# Altium footprint library lib_protel_HC_BOINA.PCBLIB: 726 footprints (part 5 of 46)
Each footprint in its own frame and in the unit in brackets; x right, y up, seen from the top. Pads: shape width x height; smd on the part's side, far side on the other; paste and mask are expansions set on the pad; w line width, h text height; cw(c..) or ccw(c..) is an arc to the next point about the centre after c.
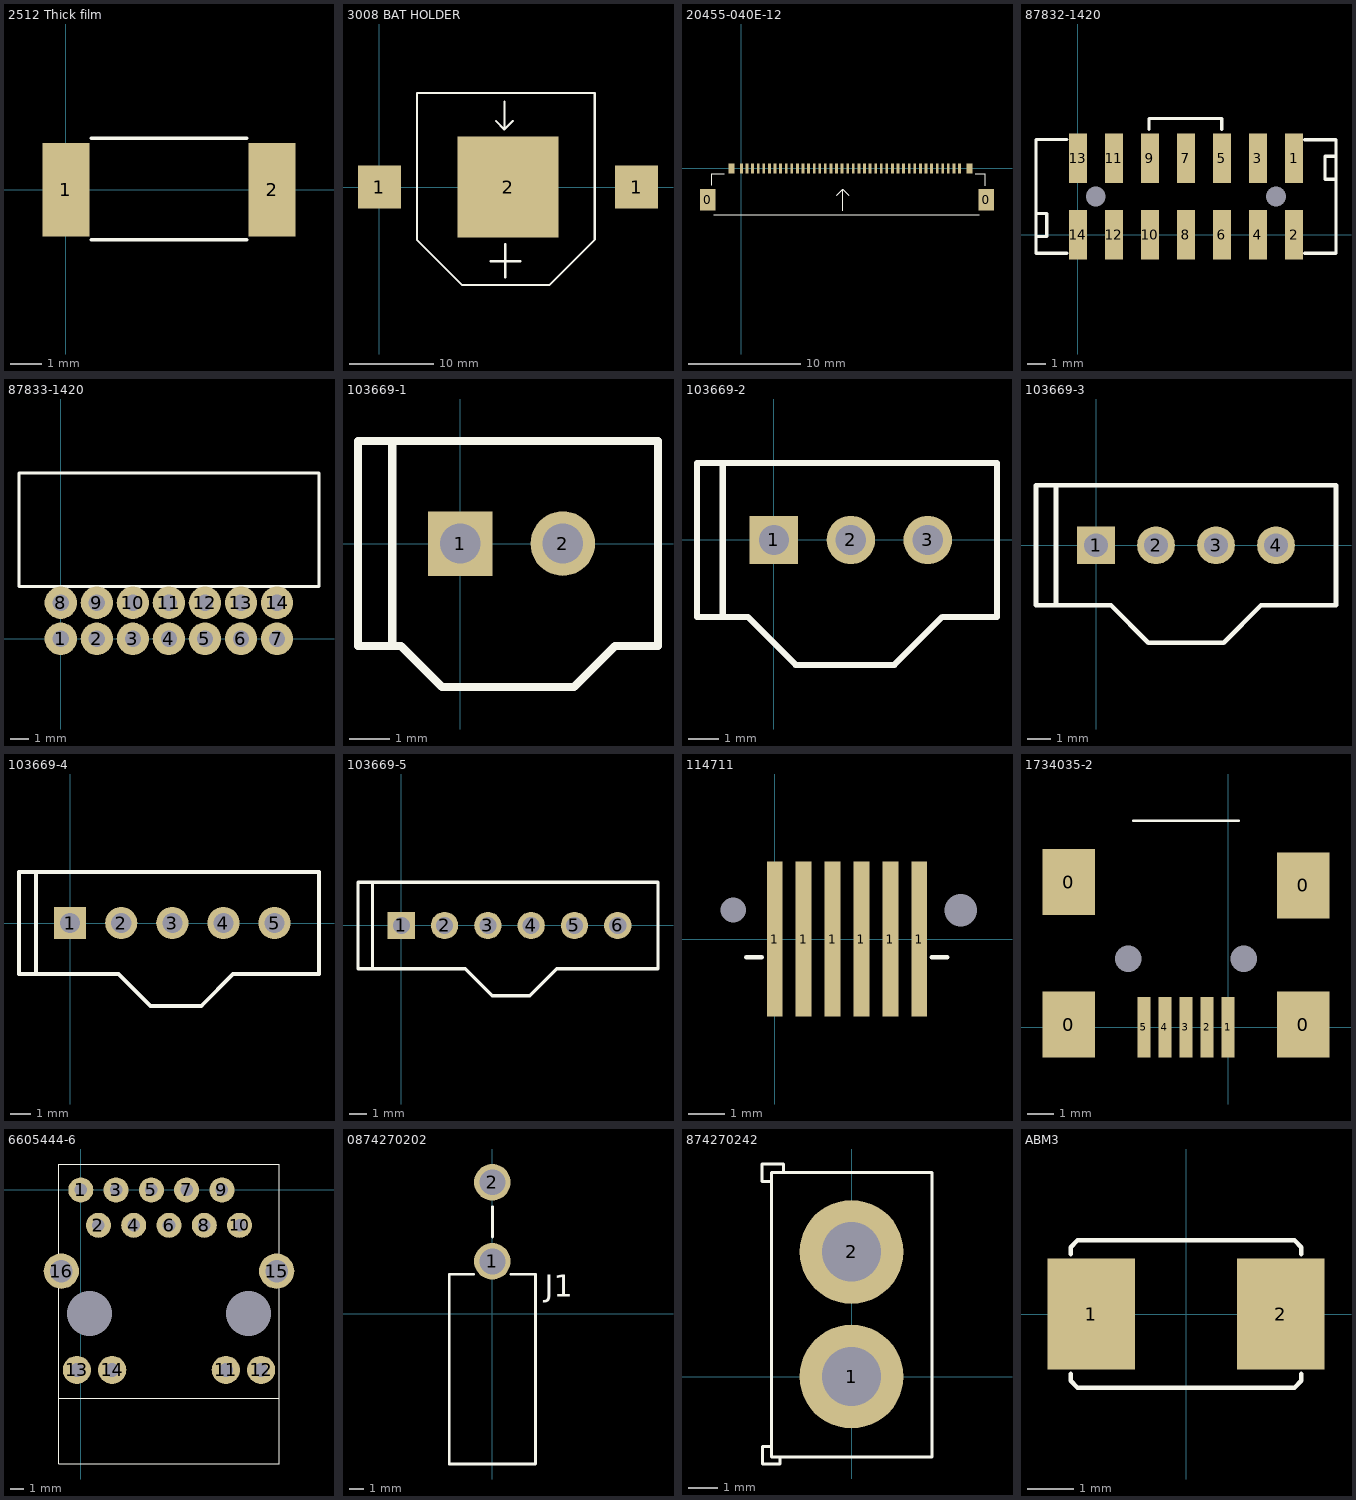
[diagram p4: the footprints below, top view; thin cyan lines are the x and y axes]

## 2512 Thick film [mm] "Thick film 2512"
height 0.55
pads (2):
  rect 1.5x3 smd: 1(0,0) 2(6.6,0)
Top Overlay:
  lines w0.1: 0.8,-1.6 5.8,-1.6 ; 0.8,1.65 5.8,1.65
3D body "User Library-RESC6432X06.step": height 0.6, standoff 0, extent 0.1,-1.6 6.5,1.6

## 3008 BAT HOLDER [mm] "PORTAPILAS PARA CR2450 O LIR2450"
height 5.8
pads (3):
  rect 5.1x5.1 smd: 1(0,0) 1(30.5,0)
  rect 12x12 smd: 2(15.25,0)
Top Overlay:
  lines w0.254: 4.44,-5.854 4.44,-1.79 4.44,11.18 25.54,11.18 ; 4.44,-5.803 4.44,-6.26 9.825,-11.645 9.85,-11.645 20.137,-11.645 25.547,-6.235 25.547,-5.854 25.547,-1.79 25.547,11.18 ; 13.152,-8.8 14.93,-8.8 16.708,-8.8 ; 13.809,7.851 14.825,6.835 ; 14.825,10.137 14.825,6.835 ; 14.93,-10.705 14.93,-6.768 ; 15.841,7.851 14.825,6.835

## 20455-040E-12 [mm] "CONNECTOR IPEX 20455-040E-12"
height 1
pads (44):
  rect 1.4x1.9 smd: 0(-3.025,-2.82) 0(21.9,-2.82)
  rect 0.55x0.9 smd: 0(-0.9,0) 0(20.4,0)
  rect 0.25x0.9 smd: 1(19.5,0) 2(19,0) 3(18.5,0) 4(18,0) 5(17.5,0) 6(17,0) 7(16.5,0) 8(16,0) 9(15.5,0) 10(15,0) 11(14.5,0) 12(14,0) 13(13.5,0) 14(13,0) 15(12.5,0) 16(12,0) 17(11.5,0) 18(11,0) 19(10.5,0) 20(10,0) 21(9.5,0) 22(9,0) 23(8.5,0) 24(8,0) 25(7.5,0) 26(7,0) 27(6.5,0) 28(6,0) 29(5.5,0) 30(5,0) 31(4.5,0) 32(4,0) 33(3.5,0) 34(3,0) 35(2.5,0) 36(2,0) 37(1.5,0) 38(1,0) 39(0.5,0) 40(0,0)
Top Overlay:
  lines w0.1: -2.65,-1.525 -2.65,-0.475 -1.525,-0.475 ; -2.475,-4.15 21.275,-4.15 ; 8.525,-2.4 9.05,-1.875 ; 9.05,-3.8 9.05,-1.875 ; 9.05,-1.9 9.05,-1.875 ; 9.575,-2.4 9.05,-1.875 ; 20.9,-0.475 21.8,-0.475 21.8,-1.575

## 87832-1420 [mm] "CONECTOR MOLEX PROG JTAG"
height 7.6
pads (16):
  round 0 hole 1.1: 0(1,2.12) 0(11,2.12)
  rect 1x2.75 smd: 1(12,4.25) 2(12,0) 3(10,4.25) 4(10,0) 5(8,4.25) 6(8,0) 7(6,4.25) 8(6,0) 9(4,4.25) 10(4,0) 11(2,4.25) 12(2,0) 13(0,4.25) 14(0,0)
Top Overlay:
  lines w0.178: -2.32,1.16 -2.31,1.17 -1.72,1.17 -1.72,-0.1 -2.31,-0.1 ; -2.32,5.27 -2.32,-1.03 -0.6,-1.03 ; -2.32,5.28 -0.61,5.28 ; 3.95,5.85 3.95,6.45 7.99,6.45 7.99,5.84 ; 12.59,5.27 14.33,5.27 14.33,-1.03 12.6,-1.03 ; 14.31,4.35 13.72,4.35 13.72,3.08 14.31,3.08 14.32,3.09

## 87833-1420 [mm] "CONECTOR MOLEX PROG JTAG"
height 6.3
pads (14):
  round 1.8 hole 0.9: 1(0,0) 2(2,0) 3(4,0) 4(6,0) 5(8,0) 6(10,0) 7(12,0) 8(0,2) 9(2,2) 10(4,2) 11(6,2) 12(8,2) 13(10,2) 14(12,2)
Top Overlay:
  lines w0.178: -2.32,2.9 14.33,2.9 14.33,9.2 -2.32,9.2 -2.32,2.9

## 103669-1 [mm] "1X2 LOCKING CONNECTOR"
height 13.6
pads (2):
  rect 1.6x1.6 hole 1: 1(0,0)
  round 1.6 hole 1: 2(2.54,0)
Top Overlay:
  lines w0.2: -1.69,-2.54 -1.69,2.54 ; 3.785,-2.591 3.835,-2.54 4.902,-2.54 4.902,2.54 -2.54,2.54 -2.54,-2.54 -1.473,-2.54 -0.457,-3.556 2.819,-3.556 3.81,-2.565

## 103669-2 [mm] "1X3 LOCKING CONNECTOR"
height 13.6
pads (3):
  rect 1.6x1.6 hole 1: 1(0,0)
  round 1.6 hole 1: 2(2.54,0) 3(5.08,0)
Top Overlay:
  lines w0.2: -1.69,-2.54 -1.69,2.54 ; -2.54,-2.54 -0.864,-2.54 0.721,-4.125 3.978,-4.125 5.563,-2.54 7.366,-2.54 7.366,2.54 -2.54,2.54 -2.54,-2.54

## 103669-3 [mm] "1X4 LOCKING CONNECTOR"
height 13.6
pads (4):
  rect 1.6x1.6 hole 1: 1(0,0)
  round 1.6 hole 1: 2(2.54,0) 3(5.08,0) 4(7.62,0)
Top Overlay:
  lines w0.2: -1.69,-2.54 -1.69,2.54 ; -2.54,-2.54 -2.54,2.54 10.16,2.54 10.16,-2.54 6.985,-2.54 5.4,-4.125 2.22,-4.125 0.635,-2.54 -2.54,-2.54

## 103669-4 [mm] "1X5 LOCKING CONNECTOR"
height 13.6
pads (5):
  rect 1.6x1.6 hole 1: 1(0,0)
  round 1.6 hole 1: 2(2.54,0) 3(5.08,0) 4(7.62,0) 5(10.16,0)
Top Overlay:
  lines w0.2: -1.69,-2.54 -1.69,2.54 ; -2.54,-2.54 2.413,-2.54 3.998,-4.125 6.518,-4.125 8.103,-2.54 12.37,-2.54 12.37,2.54 -2.54,2.54 -2.54,-2.54

## 103669-5 [mm] "1X6 LOCKING CONNECTOR"
height 13.6
pads (6):
  rect 1.6x1.6 hole 1: 1(0,0)
  round 1.6 hole 1: 2(2.54,0) 3(5.08,0) 4(7.62,0) 5(10.16,0) 6(12.7,0)
Top Overlay:
  lines w0.2: -1.69,-2.54 -1.69,2.54 ; -2.54,-2.54 -2.54,2.54 15.062,2.54 15.062,-2.54 9.119,-2.54 7.534,-4.125 5.4,-4.125 5.344,-4.125 3.759,-2.54 -2.54,-2.54

## 114711 [mm] "CONECTOR 114711 ENRI"
height 4.35
pads (8):
  round 0 hole 0.7: 0(-1.15,0.8)
  round 0 hole 0.9: 0(5.15,0.8)
  rect 0.44x4.3 smd: 1(0,0) 1(0.8,0) 1(1.6,0) 1(2.4,0) 1(3.2,0) 1(4,0)
Top Overlay:
  lines w0.127: -0.79,-0.5 -0.36,-0.5 ; 4.35,-0.5 4.77,-0.5

## 1734035-2 [mm] "usb connector"
height 4
pads (11):
  rect 2x2.5 smd: 0(-6.05,0.1) 0(-6.05,5.512) 0(2.85,0.1) 0(2.85,5.385)
  round 0 hole 1: 0(-3.8,2.6) 0(0.6,2.6)
  rect 0.5x2.3 smd: 1(0,0) 2(-0.8,0) 3(-1.6,0) 4(-2.4,0) 5(-3.2,0)
Top Overlay:
  lines w0.1: -3.6,7.848 0.4,7.848

## 6605444-6 [mm] "CONECTOR ETHERNET ALTA VELOCIDAD CON LED"
height 13.64
pads (18):
  round 0 hole 3.25 mask+0.1: 0(0.635,-8.89) 0(12.065,-8.89)
  round 1.8 hole 0.9 mask+0.1: 1(0,0) 2(1.27,-2.54) 3(2.54,0) 4(3.81,-2.54) 5(5.08,0) 6(6.35,-2.54) 7(7.62,0) 8(8.89,-2.54) 9(10.16,0) 10(11.43,-2.54)
  round 2.032 hole 1.016 mask+0.1: 11(10.439,-12.954) 12(12.979,-12.954) 13(-0.279,-12.954) 14(2.261,-12.954)
  round 2.54 hole 1.6 mask+0.1: 15(14.097,-5.842) 16(-1.397,-5.842)
Top Overlay:
  lines w0.051: -1.59,-15 14.29,-15 ; -1.59,-19.72 -1.59,1.87 14.29,1.87 14.29,-19.72 -1.59,-19.72

## 0874270202 [mm] "0874270202"
pads (2):
  round 2.54 hole 1.8: 1(0,3.65) 2(0,9.15)
Top Overlay:
  lines w0.2: -1.3,2.75 -3,2.75 -3,-10.45 3,-10.45 3,2.75 1.3,2.75 ; 0,5.35 0,7.45
  text "J1" at 3.658,1.168 h1.52
Mechanical 16:
  lines w0.1: -0.5,9.65 0.5,9.65

## 874270242 [mm] "CONNECTOR MOLEX"
height 12.8
pads (2):
  round 3.5 hole 2: 1(0,0) 2(0,4.2)
Top Overlay:
  lines w0.1: -2.692,-2.362 -2.997,-2.362 -2.997,-2.946 -2.413,-2.946 -2.413,-2.718 ; -2.692,6.579 -3.023,6.579 -3.023,7.163 -2.286,7.163 -2.286,6.883 ; -2.692,-2.718 -2.692,6.883 2.718,6.883 2.718,-2.718 -2.692,-2.718

## ABM3 [mm]
pads (2):
  rect 1.9x2.4 smd: 1(-2.05,0) 2(2.05,0)
Top Overlay:
  lines w0.1: -2.5,-1.3 -2.5,-1.45 -2.35,-1.6 2.35,-1.6 2.5,-1.45 2.5,-1.3 ; -2.5,1.3 -2.5,1.45 -2.35,1.6 2.35,1.6 2.5,1.45 2.5,1.3